# Altium integrated library CONNECTORS - PIN HEADERS.IntLib: 94 symbols (part 2 of 2)
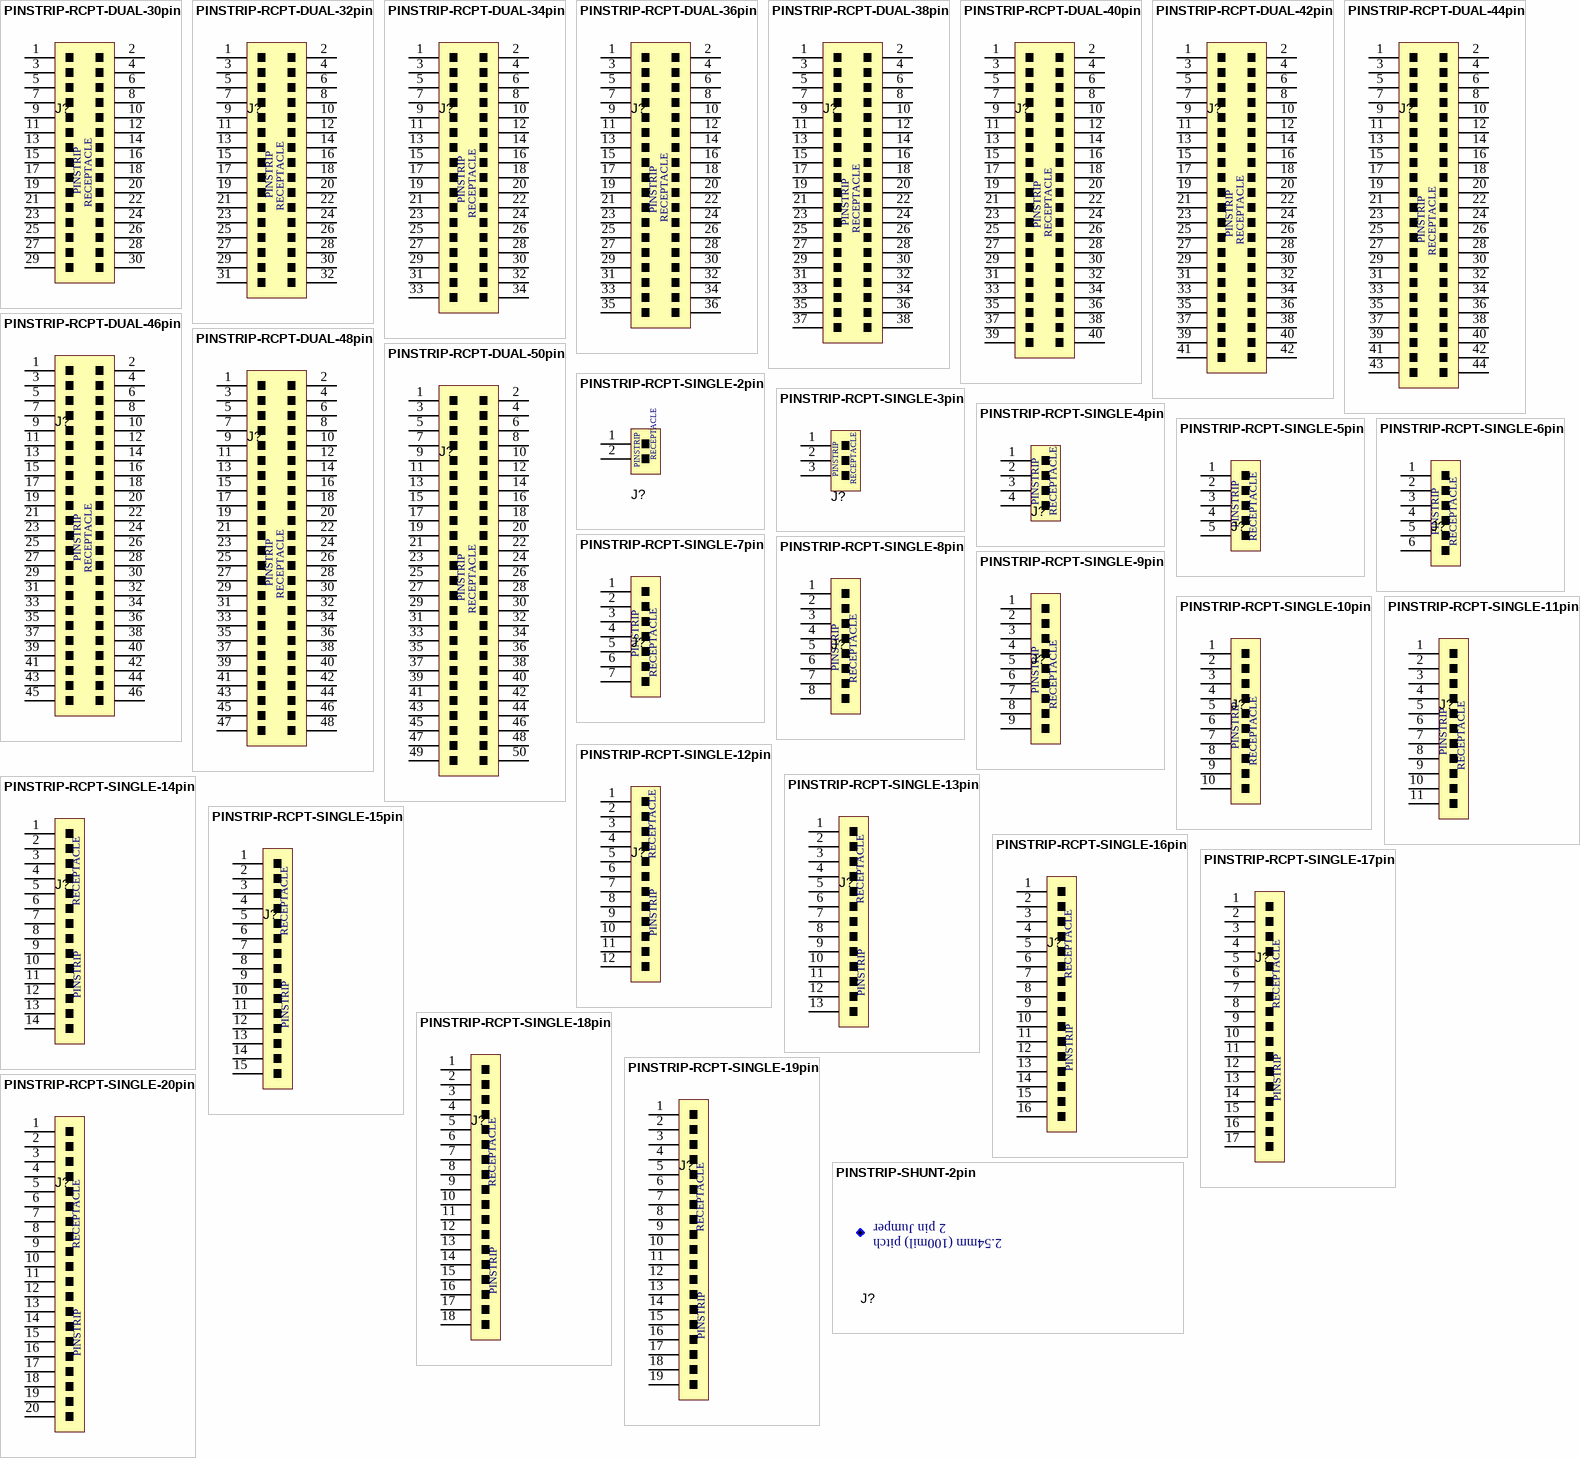
[diagram p4: symbols PINSTRIP-RCPT-DUAL-30pin to PINSTRIP-SHUNT-2pin]

## PINSTRIP-RCPT-SINGLE-12pin
designator J?, comment 6-534237-0  (value not drawn)
12 Pin Receptacle, Single row, 2.54mm pitch, Vertical; Manufacturer: TE Connectivity; Pitch: 0.100" (2.54mm); Rows: 1; Mates With (PCB): PINSTRIP-HDR-SINGLE-12pin; Connector Height: 320 mil; Mounting Type: Through Hole; PackageDescription: Pin Receptacle; 2.54mm pitch; Part Number: 6-534237-0; Pins: 12; Mates With (Wire housing): N/A; Supplier 1: Mouser; Supplier Part Number 1: 571-6-534237-0; Supplier 2: Newark; Supplier Part Number 2: 19R5175; Supplier 3: Digi-Key; Supplier Part Number 3: A32911-ND
footprint PINSTRIP-SINGLE-12PIN-.1 (2.54mm (0.100") Pitch, Through Hole, Single Row, Vertical, 12 pin)
3D model Pinstrip-100mil-SINGLE-RECP-12pin (PCB3D Model)
pins: 1, 2, 3, 4, 5, 6, 7, 8, 9, 10, 11, 12
text: RECEPTACLE; PINSTRIP

## PINSTRIP-RCPT-SINGLE-13pin
designator J?, comment 6-534237-1  (value not drawn)
13 Pin Receptacle, Single row, 2.54mm pitch, Vertical; Manufacturer: TE Connectivity; Pitch: 0.100" (2.54mm); Rows: 1; Mates With (PCB): PINSTRIP-HDR-SINGLE-13pin; Connector Height: 320 mil; Mounting Type: Through Hole; PackageDescription: Pin Receptacle; 2.54mm pitch; Part Number: 6-534237-1; Pins: 13; Mates With (Wire housing): N/A; Supplier 1: Mouser; Supplier Part Number 1: 571-1-534237-1; Supplier 2: Mouser; Supplier Part Number 2: 571-6-534237-1; Supplier 3: Digi-Key; Supplier Part Number 3: A32912-ND; Supplier 4: Newark; Supplier Part Number 4: 19R5176
footprint PINSTRIP-SINGLE-13PIN-.1 (2.54mm (0.100") Pitch, Through Hole, Single Row, Vertical, 13 pin)
3D model Pinstrip-100mil-SINGLE-RECP-13pin (PCB3D Model)
pins: 1, 2, 3, 4, 5, 6, 7, 8, 9, 10, 11, 12, 13
text: RECEPTACLE; PINSTRIP

## PINSTRIP-RCPT-SINGLE-14pin
designator J?, comment 6-534237-2  (value not drawn)
14 Pin Receptacle, Single row, 2.54mm pitch, Vertical; Manufacturer: TE Connectivity; Pitch: 0.100" (2.54mm); Rows: 1; Mates With (PCB): PINSTRIP-HDR-SINGLE-14pin; Connector Height: 320 mil; Mounting Type: Through Hole; PackageDescription: Pin Receptacle; 2.54mm pitch; Part Number: 6-534237-2; Pins: 14; Mates With (Wire housing): N/A; Supplier 1: Mouser; Supplier Part Number 1: 571-15342372; Supplier 2: Digi-Key; Supplier Part Number 2: A32913-ND; Supplier 3: Newark; Supplier Part Number 3: 12P8849; Supplier 4: Mouser; Supplier Part Number 4: 571-6-534237-2
footprint PINSTRIP-SINGLE-14PIN-.1 (2.54mm (0.100") Pitch, Through Hole, Single Row, Vertical, 14 pin)
3D model Pinstrip-100mil-SINGLE-RECP-14pin (PCB3D Model)
pins: 1, 2, 3, 4, 5, 6, 7, 8, 9, 10, 11, 12, 13, 14
text: RECEPTACLE; PINSTRIP

## PINSTRIP-RCPT-SINGLE-15pin
designator J?, comment 6-534237-3  (value not drawn)
15 Pin Receptacle, Single row, 2.54mm pitch, Vertical; Manufacturer: TE Connectivity; Pitch: 0.100" (2.54mm); Rows: 1; Mates With (PCB): PINSTRIP-HDR-SINGLE-15pin; Connector Height: 320 mil; Mounting Type: Through Hole; PackageDescription: Pin Receptacle; 2.54mm pitch; Part Number: 6-534237-3; Pins: 15; Mates With (Wire housing): N/A; Supplier 1: Mouser; Supplier Part Number 1: 571-1-534237-3; Supplier 2: Mouser; Supplier Part Number 2: 571-6-534237-3; Supplier 3: Newark; Supplier Part Number 3: 58M0043; Supplier 4: Digi-Key; Supplier Part Number 4: A32914-ND
footprint PINSTRIP-SINGLE-15PIN-.1 (2.54mm (0.100") Pitch, Through Hole, Single Row, Vertical, 15 pin)
3D model Pinstrip-100mil-SINGLE-RECP-15pin (PCB3D Model)
pins: 1, 2, 3, 4, 5, 6, 7, 8, 9, 10, 11, 12, 13, 14, 15
text: RECEPTACLE; PINSTRIP

## PINSTRIP-RCPT-SINGLE-16pin
designator J?, comment 6-534237-4  (value not drawn)
16 Pin Receptacle, Single row, 2.54mm pitch, Vertical; Manufacturer: TE Connectivity; Pitch: 0.100" (2.54mm); Rows: 1; Mates With (PCB): PINSTRIP-HDR-SINGLE-16pin; Connector Height: 320 mil; Mounting Type: Through Hole; PackageDescription: Pin Receptacle; 2.54mm pitch; Part Number: 6-534237-4; Pins: 16; Mates With (Wire housing): N/A; Supplier 1: Newark; Supplier Part Number 1: 52K3796; Supplier 2: Mouser; Supplier Part Number 2: 571-6-534237-4; Supplier 3: Newark; Supplier Part Number 3: 85C0378; Supplier 4: Digi-Key; Supplier Part Number 4: A32549-ND
footprint PINSTRIP-SINGLE-16PIN-.1 (2.54mm (0.100") Pitch, Through Hole, Single Row, Vertical, 16 pin)
3D model Pinstrip-100mil-SINGLE-RECP-16pin (PCB3D Model)
pins: 1, 2, 3, 4, 5, 6, 7, 8, 9, 10, 11, 12, 13, 14, 15, 16
text: RECEPTACLE; PINSTRIP

## PINSTRIP-RCPT-SINGLE-17pin
designator J?, comment 6-534237-5  (value not drawn)
17 Pin Receptacle, Single row, 2.54mm pitch, Vertical; Manufacturer: TE Connectivity; Pitch: 0.100" (2.54mm); Rows: 1; Mates With (PCB): PINSTRIP-HDR-SINGLE-17pin; Connector Height: 320 mil; Mounting Type: Through Hole; PackageDescription: Pin Receptacle; 2.54mm pitch; Part Number: 6-534237-5; Pins: 17; Mates With (Wire housing): N/A; Supplier 1: Mouser; Supplier Part Number 1: N/A; Supplier 2: Mouser; Supplier Part Number 2: 571-15342375
footprint PINSTRIP-SINGLE-17PIN-.1 (2.54mm (0.100") Pitch, Through Hole, Single Row, Vertical, 17 pin)
3D model Pinstrip-100mil-SINGLE-RECP-17pin (PCB3D Model)
pins: 1, 2, 3, 4, 5, 6, 7, 8, 9, 10, 11, 12, 13, 14, 15, 16, 17
text: RECEPTACLE; PINSTRIP

## PINSTRIP-RCPT-SINGLE-18pin
designator J?, comment 6-534237-6  (value not drawn)
18 Pin Receptacle, Single row, 2.54mm pitch, Vertical; Manufacturer: TE Connectivity; Pitch: 0.100" (2.54mm); Rows: 1; Mates With (PCB): PINSTRIP-HDR-SINGLE-18pin; Connector Height: 320 mil; Mounting Type: Through Hole; PackageDescription: Pin Receptacle; 2.54mm pitch; Part Number: 6-534237-6; Pins: 18; Mates With (Wire housing): N/A; Supplier 1: Mouser; Supplier Part Number 1: 571-1-534237-6; Supplier 2: Digi-Key; Supplier Part Number 2: A32915-ND; Supplier 3: Mouser; Supplier Part Number 3: 571-6-534237-6
footprint PINSTRIP-SINGLE-18PIN-.1 (2.54mm (0.100") Pitch, Through Hole, Single Row, Vertical, 18 pin)
3D model Pinstrip-100mil-SINGLE-RECP-18pin (PCB3D Model)
pins: 1, 2, 3, 4, 5, 6, 7, 8, 9, 10, 11, 12, 13, 14, 15, 16, 17, 18
text: RECEPTACLE; PINSTRIP

## PINSTRIP-RCPT-SINGLE-19pin
designator J?, comment 6-534237-7  (value not drawn)
19 Pin Receptacle, Single row, 2.54mm pitch, Vertical; Manufacturer: TE Connectivity; Pitch: 0.100" (2.54mm); Rows: 1; Mates With (PCB): PINSTRIP-HDR-SINGLE-19pin; Connector Height: 320 mil; Mounting Type: Through Hole; PackageDescription: Pin Receptacle; 2.54mm pitch; Part Number: 6-534237-7; Pins: 19; Mates With (Wire housing): N/A; Supplier 1: Mouser; Supplier Part Number 1: N/A
footprint PINSTRIP-SINGLE-19PIN-.1 (2.54mm (0.100") Pitch, Through Hole, Single Row, Vertical, 19 pin)
3D model Pinstrip-100mil-SINGLE-RECP-19pin (PCB3D Model)
pins: 1, 2, 3, 4, 5, 6, 7, 8, 9, 10, 11, 12, 13, 14, 15, 16, 17, 18, 19
text: RECEPTACLE; PINSTRIP

## PINSTRIP-RCPT-SINGLE-20pin
designator J?, comment 6-534237-8  (value not drawn)
20 Pin Receptacle, Single row, 2.54mm pitch, Vertical; Manufacturer: TE Connectivity; Pitch: 0.100" (2.54mm); Rows: 1; Mates With (PCB): PINSTRIP-HDR-SINGLE-20pin; Connector Height: 320 mil; Mounting Type: Through Hole; PackageDescription: Pin Receptacle; 2.54mm pitch; Part Number: 6-534237-8; Pins: 20; Mates With (Wire housing): N/A; Supplier 1: Mouser; Supplier Part Number 1: 571-6-534237-8; Supplier 2: Newark; Supplier Part Number 2: 93F7121; Supplier 3: Digi-Key; Supplier Part Number 3: A32916-ND
footprint PINSTRIP-SINGLE-20PIN-.1 (2.54mm (0.100") Pitch, Through Hole, Single Row, Vertical, 20 pin)
3D model Pinstrip-100mil-SINGLE-RECP-20pin (PCB3D Model)
pins: 1, 2, 3, 4, 5, 6, 7, 8, 9, 10, 11, 12, 13, 14, 15, 16, 17, 18, 19, 20
text: RECEPTACLE; PINSTRIP

## PINSTRIP-SHUNT-2pin
designator J?, comment 382811-6  (value not drawn)  (mechanical)
2 Pin Shunt/Jumper, 2.54mm pitch; Manufacturer: TE Connectivity; Pitch: 0.100" (2.54mm); Rows: 1; Mates With (PCB): All 2 pin 2.54mm(100mil) pitch pin strips; Connector Height: 320 mil; Mounting Type: Pin mount; PackageDescription: N/A; Part Number: 382811-6; Package Reference: N/A; Pins: 2; Mates With (Wire housing): N/A; Supplier 1: Digi-Key; Supplier Part Number 1: A26227-ND; Supplier 2: Mouser; Supplier Part Number 2: 571-382811-6; Supplier 3: Newark; Supplier Part Number 3: 91C5937
text: 2 pin Jumper; 2.54mm (100mil) pitch